# Altium integrated library micromouse library[Conflict].IntLib: 68 symbols
Pins are listed as number, name and electrical type; pins without a type are passive.

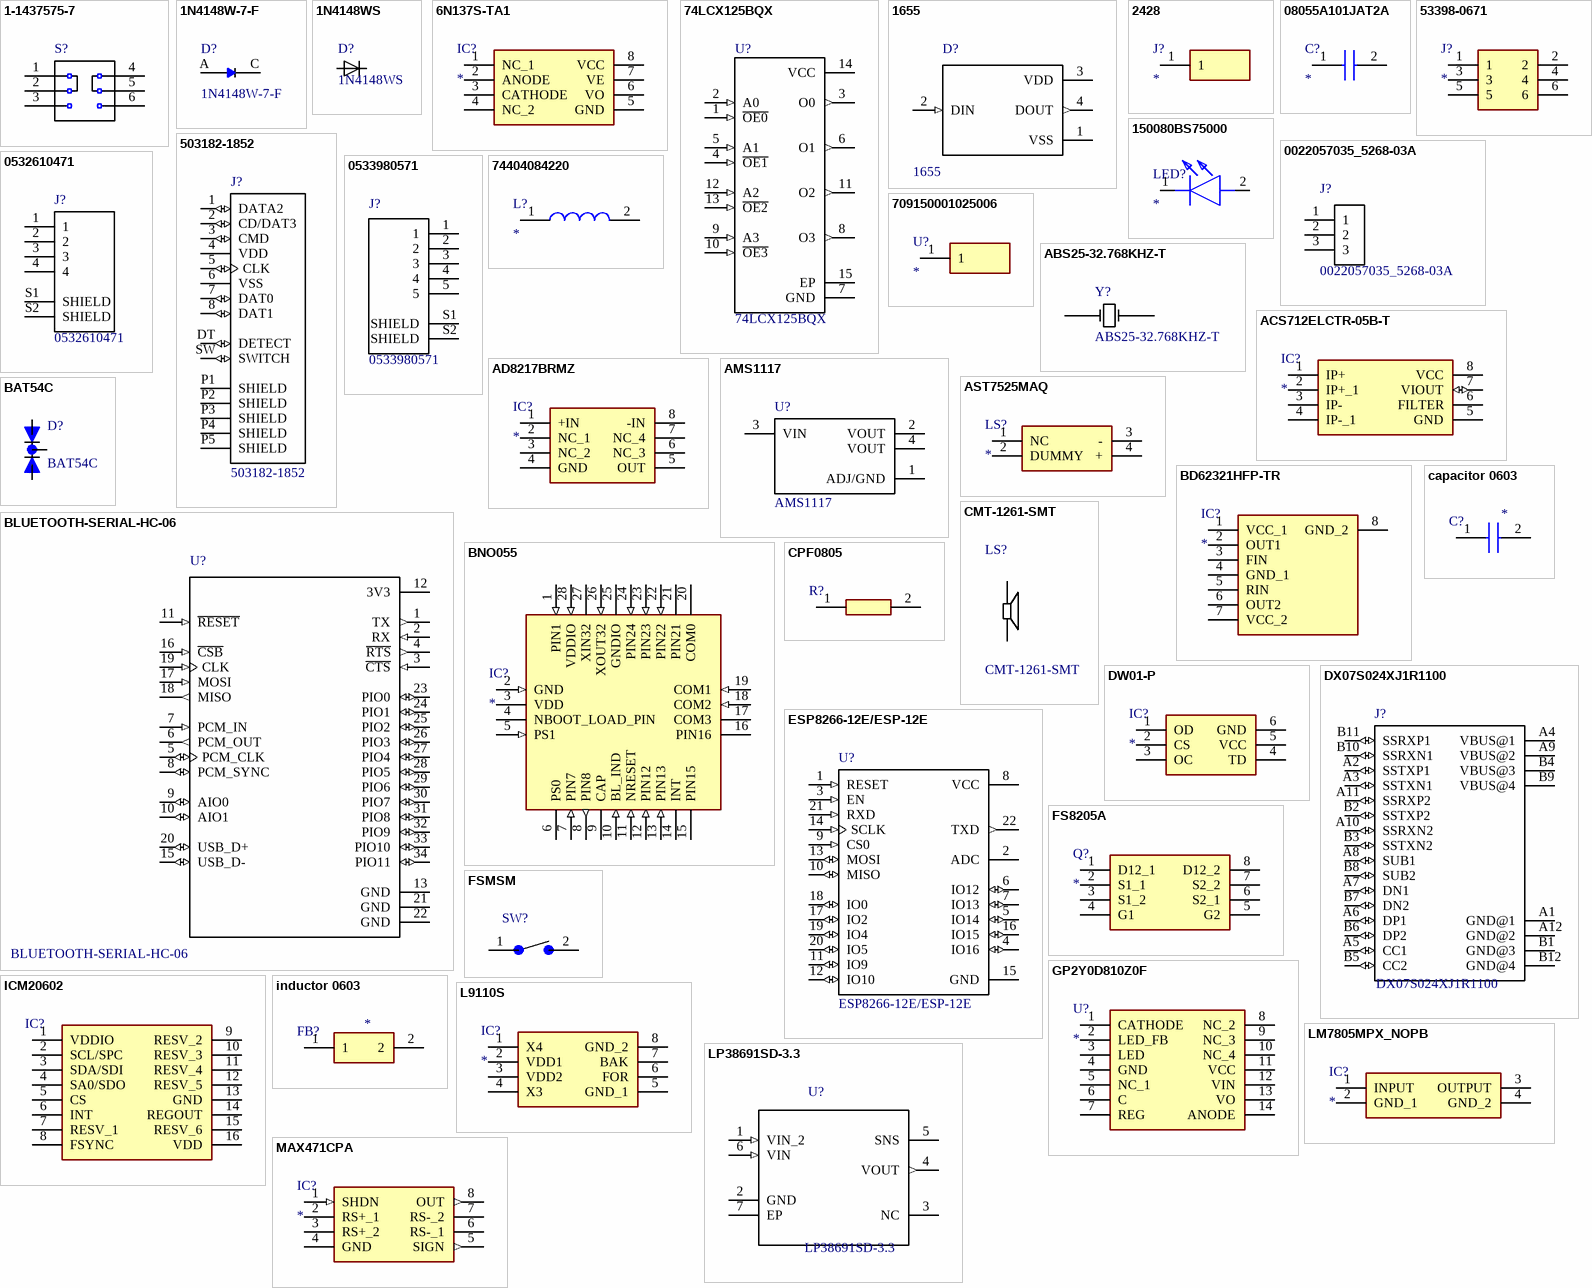
[diagram p0: symbols 1-1437575-7 to MAX471CPA]

## 1-1437575-7
designator S?  (value not drawn)
Slide Switch ON ON DPDT Top Slide 0.4VA 20VAC 20VDC 10000Cycle PC Pins Through Hole; MF: TE Connectivity; Price: None; Package: None; MP: 1-1437575-7; SnapEDA_Link: https://www.snapeda.com/parts/1-1437575-7/TE%20Connectivity%20ALCOSWITCH%20Switches/view-part/?ref=snap; Availability: Unavailable; TE_purchase_URL: https://www.te.com/usa-en/product-1-1437575-7.html?te_bu=Cor&te_type=disp&te_campaign=seda_glo_cor-seda-global-disp-prtnr-fy19-seda-model-bom-cta_sma-317_1&elqCampaignId=32493; Value: *
footprint *SW_1-1437575-7
pins: 1 (power), 2 (power), 3, 4, 5 (power), 6 (power)

## 1N4148W-7-F
designator D?
1N4148W Series 2 A 100 V 400 mW Surface Mount Fast Switching Diode - SOD-123; MF: Diodes Inc.; Package: SOD-123 Diodes Inc.; MP: 1N4148W-7-F; Price: None; Availability: Unavailable; SnapEDA_Link: https://www.snapeda.com/parts/1N4148W-7-F/Diodes%20Inc./view-part/?ref=snap; Value: *
footprint *SOD3715X135N_1N4148W-7-F(Primary)
pins: A, C K

## 1N4148WS
designator D?
Diode Switching 75V 0.3A 2-Pin SOD-323 T/R; MF: ON Semiconductor; Price: None; Package: S-0 Good-Ark; MP: 1N4148WS; Availability: Unavailable; SnapEDA_Link: https://www.snapeda.com/parts/1N4148WS/ON%20Semiconductor/view-part/?ref=snap; Value: *
footprint *SOD323_1N4148WS(Primary)
pins: A, C

## 6N137S-TA1
designator IC?
Integrated Circuit; Manufacturer_Name: Lite-On; Manufacturer_Part_Number: 6N137S-TA1; Datasheet Link: http://www.mouser.com/ds/2/239/S_110_6N137 20140411-596065.pdf; Height: 4mm; Mouser Part Number: 859-6N137STA1; Mouser Price/Stock: https://www.mouser.com/Search/Refine.aspx?Keyword=859-6N137STA1
footprint SOP254P1016X400-8N
pins: 1 NC_1, 2 ANODE, 3 CATHODE, 4 NC_2, 5 GND, 6 VO, 7 VE, 8 VCC

## 74LCX125BQX
designator U?
Buffer/Line Driver 4-CH Non-Inverting 3-ST CMOS 14-Pin DQFN EP T/R; MF: ON Semiconductor; Price: None; MP: 74LCX125BQX; Availability: Unavailable; Package: DQFN-14 Fairchild Semiconductor; SnapEDA_Link: https://www.snapeda.com/parts/74LCX125BQX/ON%20Semiconductor/view-part/?ref=snap; Value: *
footprint *QFN50P300X250X85-15N
pins: 1 ~{OE0} (in), 2 A0 (in), 3 O0 (out), 4 ~{OE1} (in), 5 A1 (in), 6 O1 (out), 7 GND (power), 8 O3 (out), 9 A3 (in), 10 ~{OE3} (in), 11 O2 (out), 12 A2 (in), 13 ~{OE2} (in), 14 VCC (power), 15 EP (power)

## 1655
designator D?
Addressable Lighting Neopixel 10 LED Discrete Serial _Shift Register_ Red, Green, Blue _RGB_ 5.00mm L x 5.00mm W; MF: Adafruit; Digi-Key_Part_Number: 1528-1104-ND; MP: 1655; Package: TO-3 Adafruit; SnapEDA_Link: https://www.snapeda.com/parts/1655/Adafruit%20Industries/view-part/4299409/?ref=snap; Digi-Key_Purchase_URL: https://www.digikey.lk/product-detail/en/adafruit-industries-llc/1655/1528-1104-ND/5154679?utm_source=snapeda&utm_medium=aggregator&utm_campaign=symbol; Value: *
footprint *LED_1655
pins: 1 VSS (power), 2 DIN (in), 3 VDD (power), 4 DOUT (out)

## 2428
designator J?
Connector; Manufacturer_Name: Adafruit; Manufacturer_Part_Number: 2428; Datasheet Link: https://www.arrow.com/en/products/2428/adafruit-industries; Height: 16.5mm; Mouser Part Number: 485-2428; Mouser Price/Stock: https://www.mouser.com/Search/Refine.aspx?Keyword=485-2428
footprint 2428
pins: 1

## 08055A101JAT2A
designator C?
Capacitor; Manufacturer_Name: AVX; Manufacturer_Part_Number: 08055A101JAT2A; Allied_Number: 70474488; Datasheet Link: https://componentsearchengine.com/Datasheets/1/06031A100FAT2A.pdf; Height: 0.94mm; Mouser Part Number: 581-08055A101J; Mouser Price/Stock: https://www.mouser.com/Search/Refine.aspx?Keyword=581-08055A101J; RS Part Number: 0391000P; RS Price/Stock: http://uk.rs-online.com/web/p/products/0391000P; Allied Price/Stock: https://www.alliedelec.com/avx-08055a101jat2a/70474488/
footprint CAPC2012X94N
pins: 1, 2

## 53398-0671
designator J?
Connector; Manufacturer_Name: Molex; Manufacturer_Part_Number: 53398-0671; Allied_Number: 70090674; Datasheet Link: http://docs-emea.rs-online.com/webdocs/13c4/0900766b813c4502.pdf; Mouser Part Number: 538-53398-0671; Mouser Price/Stock: https://www.mouser.com/Search/Refine.aspx?Keyword=538-53398-0671; RS Part Number: 5427214P; RS Price/Stock: http://uk.rs-online.com/web/p/products/5427214P; Allied Price/Stock: http://www.alliedelec.com/molex-incorporated-53398-0671/70090674/
footprint 533980671
pins: 1, 2, 3, 4, 5, 6

## 150080BS75000
designator LED?
LED; Manufacturer_Name: Wurth Elektronik; Manufacturer_Part_Number: 150080BS75000; Datasheet Link: https://katalog.we-online.com/led/datasheet/150080BS75000.pdf; Height: 0.8mm; Mouser Part Number: 710-150080BS75000; Mouser Price/Stock: https://www.mouser.com/Search/Refine.aspx?Keyword=710-150080BS75000; RS Part Number: 8154228P; RS Price/Stock: http://uk.rs-online.com/web/p/products/8154228P
footprint LEDC2012X80N
pins: 1 K, 2 A

## 503182-1852
designator J?
MICRO SD NORMAL ULTRALOWPRO8CKTE; MF: Molex; MP: 5031821852; Availability: Unavailable; Package: None; Price: None; SnapEDA_Link: https://www.snapeda.com/parts/5031821852/Molex/view-part/?ref=snap; Value: *
footprint *MOLEX_503182-1852_503182-1852(Primary)
pins: 1 DATA2 (io), 2 CD/DAT3 (io), 3 CMD (io), 4 VDD (power), 5 CLK (io), 6 VSS (power), 7 DAT0 (io), 8 DAT1 (io), DT DETECT (io), P1 SHIELD, P2 SHIELD, P3 SHIELD, P4 SHIELD, P5 SHIELD, SW SWITCH (io)

## 0022057035_5268-03A
designator J?
Socket; wire-board; male; PIN: 3; 2.5mm; THT; SPOX; 3A; tinned; 20; MP: 0022057035 5268-03A; MF: Molex; Availability: Unavailable; Package: None; Price: None; SnapEDA_Link: https://www.snapeda.com/parts/0022057035%205268-03A/Molex/view-part/?ref=snap; Value: *
footprint *MOLEX_0022057035_5268-03A
pins: 1, 2, 3

## 0532610471
designator J?
/ Conn Shrouded Header HDR 4 POS 1.25mm Solder RA SMD PicoBladeâ„¢ Embossed T/R /; MF: Molex; Package: None; MP: 0532610471; Availability: Unavailable; Price: None; SnapEDA_Link: https://www.snapeda.com/parts/0532610471/Molex/view-part/?ref=snap; Value: *
footprint *MOLEX_0532610471_0532610471(Primary)
pins: 1, 2, 3, 4, S1 SHIELD, S2 SHIELD

## 0533980571
designator J?
/ Conn Shrouded Header HDR 5 POS 1.25mm Solder ST SMD PicoBladeÃƒÂ¢Ã¢Â€ÂžÂ¢ Embossed T/R /; MF: Molex; MP: 0533980571; Availability: Unavailable; SnapEDA_Link: https://www.snapeda.com/parts/0533980571/Molex/view-part/472893/?ref=snap; Package: None; Price: None; Value: *
footprint *MOLEX_0533980571_0533980571(Primary)
pins: 1, 2, 3, 4, 5, S1 SHIELD, S2 SHIELD

## 74404084220
designator L?
Inductor; Manufacturer_Name: Wurth Elektronik; Manufacturer_Part_Number: 74404084220; Datasheet Link: https://katalog.we-online.de/pbs/datasheet/74404084220.pdf; Height: 4.2mm; Mouser Part Number: 710-74404084220; Mouser Price/Stock: https://www.mouser.com/Search/Refine.aspx?Keyword=710-74404084220; RS Part Number: 8164733P; RS Price/Stock: http://uk.rs-online.com/web/p/products/8164733P
footprint INDPM8080X420N
pins: 1, 2

## 709150001025006
designator U?
Undefined or Miscellaneous; Manufacturer_Name: AVX; Manufacturer_Part_Number: 709150001025006; Datasheet Link: https://componentsearchengine.com/Datasheets/2/709150001025006.pdf; Height: 5.6mm; Mouser Part Number: 581-709150001025006; Mouser Price/Stock: https://www.mouser.com/Search/Refine.aspx?Keyword=581-709150001025006
footprint 709150001025006
pins: 1

## ABS25-32.768KHZ-T
designator Y?
32.768 Mhz Plastic Smt Low Pro; MF: Abracon LLC; Price: None; Package: None; MP: ABS25-32.768KHZ; Availability: Unavailable; SnapEDA_Link: https://www.snapeda.com/parts/ABS25-32.768KHZ/Abracon%20LLC/view-part/?ref=snap; Value: *
footprint *XTAL_ABS25-32.768KHZ-6-1-T
pins: 1, 4

## ACS712ELCTR-05B-T
designator IC?
Integrated Circuit; Manufacturer_Name: Allegro Microsystems; Manufacturer_Part_Number: ACS712ELCTR-05B-T; Allied_Number: R1076681; Datasheet Link: http://docs-emea.rs-online.com/webdocs/0d88/0900766b80d885f5.pdf; Height: 1.75mm; RS Part Number: 6807131P; RS Price/Stock: http://uk.rs-online.com/web/p/products/6807131P; Allied Price/Stock: http://www.alliedelec.com/allegro-microsystems-acs712elctr-05b-t/R1076681/
footprint SOIC127P600X175-8N
pins: 1 IP+, 2 IP+_1, 3 IP-, 4 IP-_1, 5 GND (power), 6 FILTER, 7 VIOUT (io), 8 VCC (power)

## AD8217BRMZ
designator IC?
Integrated Circuit; Manufacturer_Name: Analog Devices; Manufacturer_Part_Number: AD8217BRMZ; Datasheet Link: https://www.analog.com/media/en/technical-documentation/data-sheets/AD8217.pdf; Height: 1.1mm; Mouser Part Number: 584-AD8217BRMZ; Mouser Price/Stock: https://www.mouser.com/Search/Refine.aspx?Keyword=584-AD8217BRMZ; RS Part Number: 7590014P; RS Price/Stock: http://uk.rs-online.com/web/p/products/7590014P
footprint SOP65P490X110-8N
pins: 1 +IN, 2 NC_1, 3 NC_2, 4 GND, 5 OUT, 6 NC_3, 7 NC_4, 8 -IN

## AMS1117
designator U?
1A LOW DROPOUT VOLTAGE REGULATOR; MF: Seeed Technology; MP: AMS1117; SnapEDA_Link: https://www.snapeda.com/parts/AMS1117/Seeed%20Technology%20Co.%2C%20Ltd/view-part/?ref=snap; Price: None; Package: SOT-223 Seeed Technology; Availability: Unavailable; Value: *
footprint *SOT229P700X180-4N
pins: 1 ADJ/GND (power), 2 VOUT (power), 3 VIN (power), 4 VOUT (power)

## AST7525MAQ
designator LS?
Loudspeaker or Buzzer; Manufacturer_Name: Mallory Sonalert; Manufacturer_Part_Number: AST7525MAQ; Allied_Number: 70186690; Datasheet Link: https://www.mspindy.com/specifications/AST7525MAQ.PDF; Height: 2.5mm; Mouser Part Number: 539-AST7525MAQ; Mouser Price/Stock: https://www.mouser.com/Search/Refine.aspx?Keyword=539-AST7525MAQ; Allied Price/Stock: https://www.alliedelec.com/mallory-sonalert-ast7525maq/70186690/
footprint AST7525MAQ
pins: 1 NC, 2 DUMMY, 3 -, 4 +

## BAT54C
designator D?
MF: ON Semiconductor; Package: SOT-23-3 ON Semiconductor; Availability: Unavailable; MP: BAT54C; SnapEDA_Link: https://www.snapeda.com/parts/BAT54C/ON%20Semiconductor/view-part/?ref=snap; Price: None; Value: *
footprint *SOT23-R
pins: 1 A1, 2 A2, 3 C

## BD62321HFP-TR
designator IC?
Integrated Circuit; Manufacturer_Name: ROHM Semiconductor; Manufacturer_Part_Number: BD62321HFP-TR; Datasheet Link: http://rohmfs.rohm.com/en/products/databook/datasheet/ic/motor/dc/bd62321hfp-e.pdf; Mouser Part Number: 755-BD62321HFP-TR; Mouser Price/Stock: https://www.mouser.com/Search/Refine.aspx?Keyword=755-BD62321HFP-TR; RS Part Number: 1246483P; RS Price/Stock: http://uk.rs-online.com/web/p/products/1246483P
footprint HRP7
pins: 1 VCC_1, 2 OUT1, 3 FIN, 4 GND_1, 5 RIN, 6 OUT2, 7 VCC_2, 8 GND_2

## BLUETOOTH-SERIAL-HC-06
designator U?
Bluetooth Modules _802.15.1_ BLUETOOTH-SERIAL-HC-06; MF: Olimex; Price: None; MP: BLUETOOTH-SERIAL-HC-06; Package: None; SnapEDA_Link: https://www.snapeda.com/parts/BLUETOOTH-SERIAL-HC-06/Olimex/view-part/?ref=snap; Availability: Unavailable; Value: *
footprint *XCVR_BLUETOOTH-SERIAL-HC-06
pins: 1 TX (out), 2 RX (in), 3 ~{CTS} (in), 4 ~{RTS} (out), 5 PCM_CLK (io), 6 PCM_OUT (out), 7 PCM_IN (in), 8 PCM_SYNC (io), 9 AIO0 (io), 10 AIO1 (io), 11 ~{RESET} (in), 12 3V3 (power), 13 GND (power), 15 USB_D- (io), 16 ~{CSB} (in), 17 MOSI (in), 18 MISO (out), 19 CLK (in), 20 USB_D+ (io), 21 GND (power), 22 GND (power), 23 PIO0 (io), 24 PIO1 (io), 25 PIO2 (io), 26 PIO3 (io), 27 PIO4 (io), 28 PIO5 (io), 29 PIO6 (io), 30 PIO7 (io), 31 PIO8 (io), 32 PIO9 (io), 33 PIO10 (io), 34 PIO11 (io)

## BNO055
designator IC?
Integrated Circuit; Manufacturer_Name: Bosch Sensortec; Manufacturer_Part_Number: BNO055; Datasheet Link: https://ae-bst.resource.bosch.com/media/_tech/media/datasheets/BST_BNO055_DS000_14.pdf; Height: 1mm; Mouser Part Number: 262-BNO055; Mouser Price/Stock: https://www.mouser.com/Search/Refine.aspx?Keyword=262-BNO055
footprint BNO055
pins: 1 PIN1 (in), 2 GND (in), 3 VDD (power), 4 NBOOT_LOAD_PIN (power), 5 PS1 (in), 6 PS0 (power), 7 PIN7 (in), 8 PIN8 (out), 9 CAP (power), 10 BL_IND (in), 11 NRESET (in), 12 PIN12 (in), 13 PIN13 (in), 14 INT, 15 PIN15, 16 PIN16, 17 COM3, 18 COM2 (in), 19 COM1 (in), 20 COM0, 21 PIN21, 22 PIN22 (in), 23 PIN23 (in), 24 PIN24 (in), 25 GNDIO, 26 XOUT32 (in), 27 XIN32, 28 VDDIO (in)

## capacitor 0603
designator C?
Capacitor; value: *
footprint *CAPC1608X95N
pins: 1, 2

## CMT-1261-SMT
designator LS?
16.9 mm, 20 V, 90 dB, Surface Mount _SMT_, Piezo Audio Transducer Buzzer; MF: CUI Devices; Price: None; Package: CUI Inc.; MP: CMT-1261-SMT; Availability: Unavailable; SnapEDA_Link: https://www.snapeda.com/parts/CMT-1261-SMT/CUI%20Devices/view-part/?ref=snap; CUI_purchase_URL: https://www.cuidevices.com/product/audio/buzzers/audio-transducers/cmt-1261-smt?utm_source=snapeda.com&utm_medium=referral&utm_campaign=snapedaBOM; Value: *
footprint *CUI_CMT-1261-SMT
pins: 1, 2

## CPF0805
designator R?  (value not drawn)
Resistor; Manufacturer_Name: TE Connectivity; Manufacturer_Part_Number: CPF0805B100KE; Allied_Number: 70286772; Datasheet Link: http://docs-europe.electrocomponents.com/webdocs/13d1/0900766b813d116f.pdf; Height: 0.65mm; Mouser Part Number: 279-CPF0805B100KE; Mouser Price/Stock: https://www.mouser.com/Search/Refine.aspx?Keyword=279-CPF0805B100KE; RS Part Number: 6662673; RS Price/Stock: https://uk.rs-online.com/web/p/products/6662673; Allied Price/Stock: https://www.alliedelec.com/te-connectivity-cpf0805b100ke/70286772/; Value: *
footprint RESC2012X65N
pins: 1, 2

## DW01-P
designator IC?
Integrated Circuit; Manufacturer_Name: Fortune Semiconductor Corporation; Manufacturer_Part_Number: DW01-P; Datasheet Link: https://cdn.sparkfun.com/assets/learn_tutorials/2/5/1/DW01-P_DataSheet_V10.pdf; Height: 1.35mm; ComponentLink1Description: DW01; ComponentLink1URL: https://lcsc.com/product-detail/MOSFET_DW01_C181096.html
footprint SOT95P280X135-6N
pins: 1 OD, 2 CS, 3 OC, 4 TD, 5 VCC, 6 GND

## DX07S024XJ1R1100
designator J?
Cut Tape - Usb Type c Receptacle Mid Mnt Dual r; MF: JAE Electronics; SnapEDA_Link: https://www.snapeda.com/parts/DX07S024XJ1R1100/JAE%20Electronics/view-part/?ref=snap; Package: None; MP: DX07S024XJ1R1100; Availability: Unavailable; Price: None; Value: *
footprint *JAE_DX07S024XJ1R1100_DX07S024XJ1R1100(Primary)
pins: A1 GND@1 (power), A2 SSTXP1 (io), A3 SSTXN1 (io), A4 VBUS@1 (power), A5 CC1 (io), A6 DP1 (io), A7 DN1 (io), A8 SUB1 (io), A9 VBUS@2 (power), A10 SSRXN2 (io), A11 SSRXP2 (io), A12 GND@2 (power), B1 GND@3 (power), B2 SSTXP2 (io), B3 SSTXN2 (io), B4 VBUS@3 (power), B5 CC2 (io), B6 DP2 (io), B7 DN2 (io), B8 SUB2 (io), B9 VBUS@4 (power), B10 SSRXN1 (io), B11 SSRXP1 (io), B12 GND@4 (power)

## ESP8266-12E/ESP-12E
designator U?
This WiFi module has a 32-bit MCU micro and clock speeds supporting 80 MHz or 160 MHz. Supports the RTOS and integrated Wi-Fi MAC/BB/RF/PA/LNA, and has an on-board antenna.; MF: AI-Thinker; Price: None; MP: ESP8266-12E/ESP-12E; Package: None; SnapEDA_Link: https://www.snapeda.com/parts/ESP8266-12E/ESP-12E/AI-Thinker/view-part/?ref=snap; Availability: Unavailable; Value: *
footprint *XCVR_ESP8266-12E/ESP-12E
pins: 1 RESET (in), 2 ADC, 3 EN (in), 4 IO16 (io), 5 IO14 (io), 6 IO12 (io), 7 IO13 (io), 8 VCC (power), 9 CS0 (in), 10 MISO (io), 11 IO9 (io), 12 IO10 (io), 13 MOSI (io), 14 SCLK (in), 15 GND (power), 16 IO15 (io), 17 IO2 (io), 18 IO0 (io), 19 IO4 (io), 20 IO5 (io), 21 RXD (in), 22 TXD (out)

## FS8205A
designator Q?
Transistor; Manufacturer_Name: SII Semiconductor; Manufacturer_Part_Number: FS8205A; Datasheet Link: http://www.ic-fortune.com/upload/Download/FS8205A-DS-12_EN.pdf; Height: 1.2mm
footprint SOP65P640X120-8N
pins: 1 D12_1, 2 S1_1, 3 S1_2, 4 G1, 5 G2, 6 S2_1, 7 S2_2, 8 D12_2

## FSMSM
designator SW?, comment 1437566-3  (value not drawn)
Switch Tactile OFF _ON_ SPST Rectangular Button Gull Wing 0.05A 12VDC SMD Loose Piece; MF: TE Connectivity; MP: FSMSM; Configuration_Pole-Throw: Single Pole - Single Throw; Contact_Current_Rating: 50 mA; Availability: Unavailable; Price: None; Package: None; SnapEDA_Link: https://www.snapeda.com/parts/FSMSM/TE%20Connectivity%20ALCOSWITCH%20Switches/view-part/?ref=snap; TE_purchase_URL: https://www.te.com/usa-en/product-1437566-3.html?te_bu=Cor&te_type=disp&te_campaign=seda_glo_cor-seda-global-disp-prtnr-fy19-seda-model-bom-cta_sma-317_1&elqCampaignId=32493; Value: *
footprint *TE_FSMSM
pins: 1, 2

## GP2Y0D810Z0F
designator U?
Undefined or Miscellaneous; Manufacturer_Name: Sharp Microelectronics; Manufacturer_Part_Number: GP2Y0D810Z0F; Allied_Number: R1016464; Datasheet Link: http://docs-emea.rs-online.com/webdocs/0d1b/0900766b80d1bdd5.pdf; Mouser Part Number: 852-GP2Y0D810Z0F; Mouser Price/Stock: https://www.mouser.com/Search/Refine.aspx?Keyword=852-GP2Y0D810Z0F; RS Part Number: 6666580P; RS Price/Stock: http://uk.rs-online.com/web/p/products/6666580P; Allied Price/Stock: https://www.alliedelec.com/sharp-gp2y0d810z0f/R1016464/
footprint GP2Y0D810Z0F
pins: 1 CATHODE, 2 LED_FB, 3 LED, 4 GND, 5 NC_1, 6 C, 7 REG, 8 NC_2, 9 NC_3, 10 NC_4, 11 VCC, 12 VIN, 13 VO, 14 ANODE

## ICM20602
designator IC?  (value not drawn)
Integrated Circuit
footprint PULL-BACK-QFN-16
pins: 1 VDDIO, 2 SCL/SPC, 3 SDA/SDI, 4 SA0/SDO, 5 CS, 6 INT, 7 RESV_1, 8 FSYNC, 9 RESV_2, 10 RESV_3, 11 RESV_4, 12 RESV_5, 13 GND, 14 REGOUT, 15 RESV_6, 16 VDD

## inductor 0603
designator FB?
Ferrite Bead; value: *
footprint BEADC1608X95N
pins: 1, 2

## L9110S
designator IC?
Integrated Circuit; Manufacturer_Name: Wuxi I-core Elec; Manufacturer_Part_Number: L9110S; Datasheet Link: https://datasheet.lcsc.com/szlcsc/Wuxi-Zhongwei-Aisin-Elec-L9110S_C85174.pdf; Height: 1.75mm
footprint SOIC127P600X175-8N
pins: 1 X4, 2 VDD1, 3 VDD2, 4 X3, 5 GND_1, 6 FOR, 7 BAK, 8 GND_2

## LM7805MPX_NOPB
designator IC?
Integrated Circuit; Manufacturer_Name: Texas Instruments; Manufacturer_Part_Number: LM7805MPX/NOPB; Datasheet Link: https://www.arrow.com/en/products/lm7805mpxnopb/texas-instruments; Height: 1.8mm; Mouser Part Number: 595-LM7805MPX/NOPB; Mouser Price/Stock: https://www.mouser.com/Search/Refine.aspx?Keyword=595-LM7805MPX%2FNOPB
footprint SOT230P700X180-4N
pins: 1 INPUT, 2 GND_1, 3 OUTPUT, 4 GND_2

## LP38691SD-3.3
designator U?
500mA Low Dropout CMOS Linear Regulators Stable with Ceramic Output Capacitors 6-WSON -40 to 125; MF: Texas Instruments; MP: LP38691SD-3.3; Price: None; SnapEDA_Link: https://www.snapeda.com/parts/LP38691SD-3.3/Texas%20Instruments/view-part/?ref=snap; Availability: Unavailable; Package: WDFN-6 Texas Instruments; Value: *
footprint *DFN300X300X80-7N
pins: 1 VIN_2 (in), 2 GND, 3 NC, 4 VOUT (out), 5 SNS, 6 VIN (in), 7 EP

## MAX471CPA
designator IC?
Integrated Circuit; Manufacturer_Name: Maxim Integrated; Manufacturer_Part_Number: MAX471CPA; Datasheet Link: https://pdfserv.maximintegrated.com/en/ds/MAX471-MAX472.pdf; Height: 1.75mm; Mouser Part Number: 700-MAX471CPANR; Mouser Price/Stock: https://www.mouser.com/Search/Refine.aspx?Keyword=700-MAX471CPANR; RS Part Number: 0810352; RS Price/Stock: http://uk.rs-online.com/web/p/products/0810352
footprint SOIC127P600X175-8N
pins: 1 SHDN (in), 2 RS+_1 (power), 3 RS+_2 (power), 4 GND (power), 5 SIGN (out), 6 RS-_1 (power), 7 RS-_2 (power), 8 OUT (out)

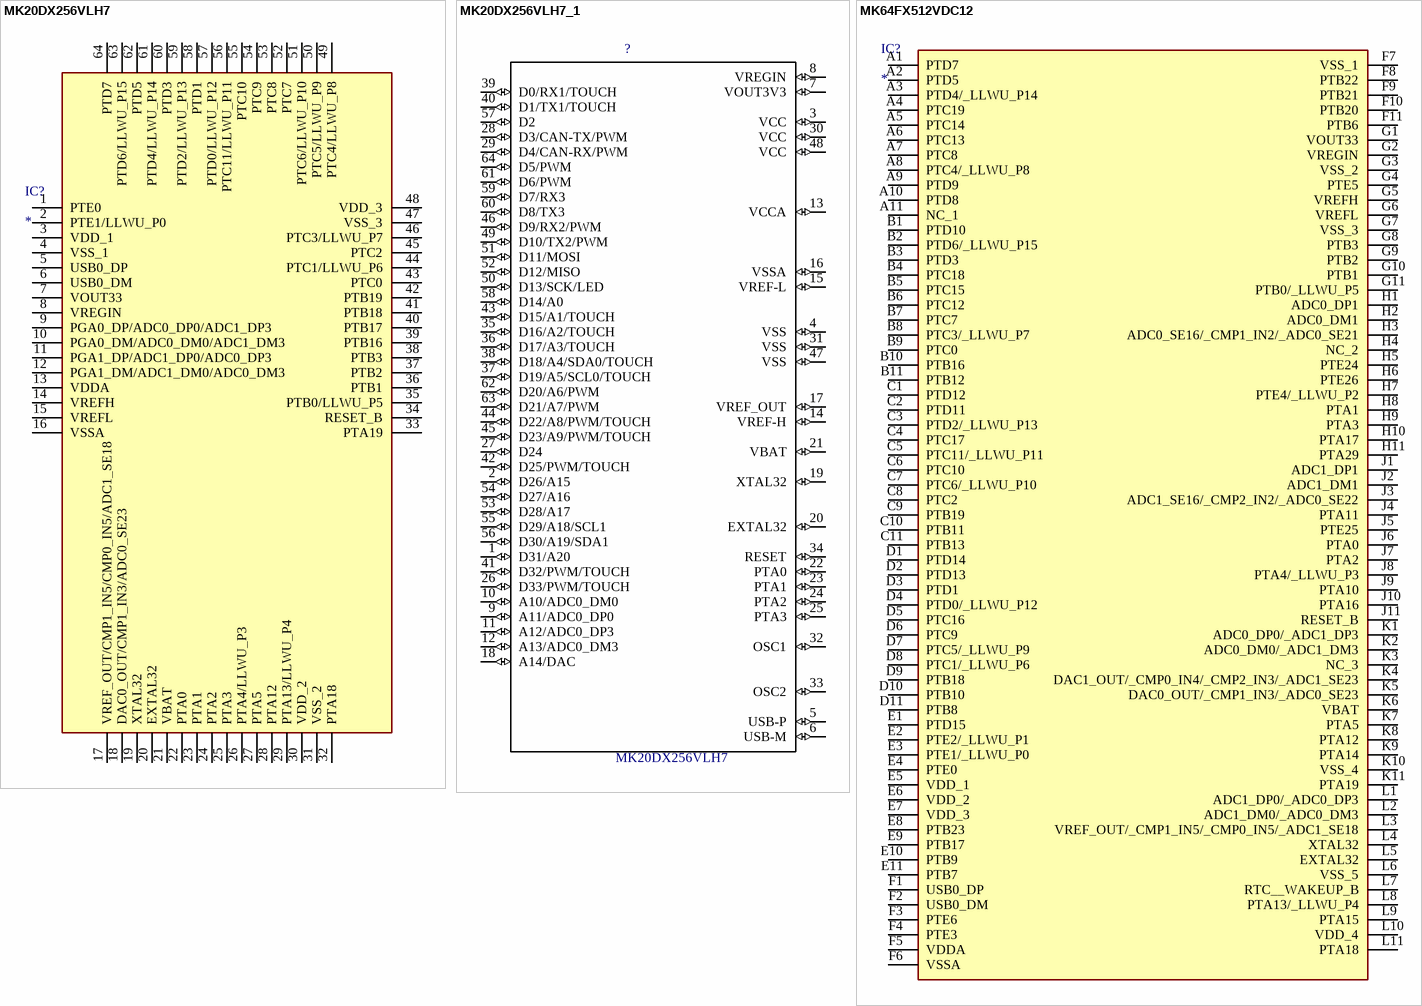
[diagram p1: symbols MK20DX256VLH7 to MK64FX512VDC12]

## MK20DX256VLH7
designator IC?
Integrated Circuit; Manufacturer_Name: Nexperia; Manufacturer_Part_Number: MK20DX256VLH7; Datasheet Link: https://www.nxp.com/docs/en/data-sheet/K20P64M72SF1.pdf; Height: 1.6mm; Mouser Part Number: 841-MK20DX256VLH7; Mouser Price/Stock: https://www.mouser.com/Search/Refine.aspx?Keyword=841-MK20DX256VLH7; RS Part Number: 7862120P; RS Price/Stock: http://uk.rs-online.com/web/p/products/7862120P
footprint QFP50P1200X1200X160-64N
pins: 1 PTE0, 2 PTE1/LLWU_P0, 3 VDD_1, 4 VSS_1, 5 USB0_DP, 6 USB0_DM, 7 VOUT33, 8 VREGIN, 9 PGA0_DP/ADC0_DP0/ADC1_DP3, 10 PGA0_DM/ADC0_DM0/ADC1_DM3, 11 PGA1_DP/ADC1_DP0/ADC0_DP3, 12 PGA1_DM/ADC1_DM0/ADC0_DM3, 13 VDDA, 14 VREFH, 15 VREFL, 16 VSSA, 17 VREF_OUT/CMP1_IN5/CMP0_IN5/ADC1_SE18, 18 DAC0_OUT/CMP1_IN3/ADC0_SE23, 19 XTAL32, 20 EXTAL32, 21 VBAT, 22 PTA0, 23 PTA1, 24 PTA2, 25 PTA3, 26 PTA4/LLWU_P3, 27 PTA5, 28 PTA12, 29 PTA13/LLWU_P4, 30 VDD_2, 31 VSS_2, 32 PTA18, 33 PTA19, 34 RESET_B, 35 PTB0/LLWU_P5, 36 PTB1, 37 PTB2, 38 PTB3, 39 PTB16, 40 PTB17, 41 PTB18, 42 PTB19, 43 PTC0, 44 PTC1/LLWU_P6, 45 PTC2, 46 PTC3/LLWU_P7, 47 VSS_3, 48 VDD_3, 49 PTC4/LLWU_P8, 50 PTC5/LLWU_P9, 51 PTC6/LLWU_P10, 52 PTC7, 53 PTC8, 54 PTC9, 55 PTC10, 56 PTC11/LLWU_P11, 57 PTD0/LLWU_P12, 58 PTD1, 59 PTD2/LLWU_P13, 60 PTD3, 61 PTD4/LLWU_P14, 62 PTD5, 63 PTD6/LLWU_P15, 64 PTD7
